# Altium schematic symbol library 13-Logic 数字 IC.SchLib: 324 symbols (part 6 of 30)
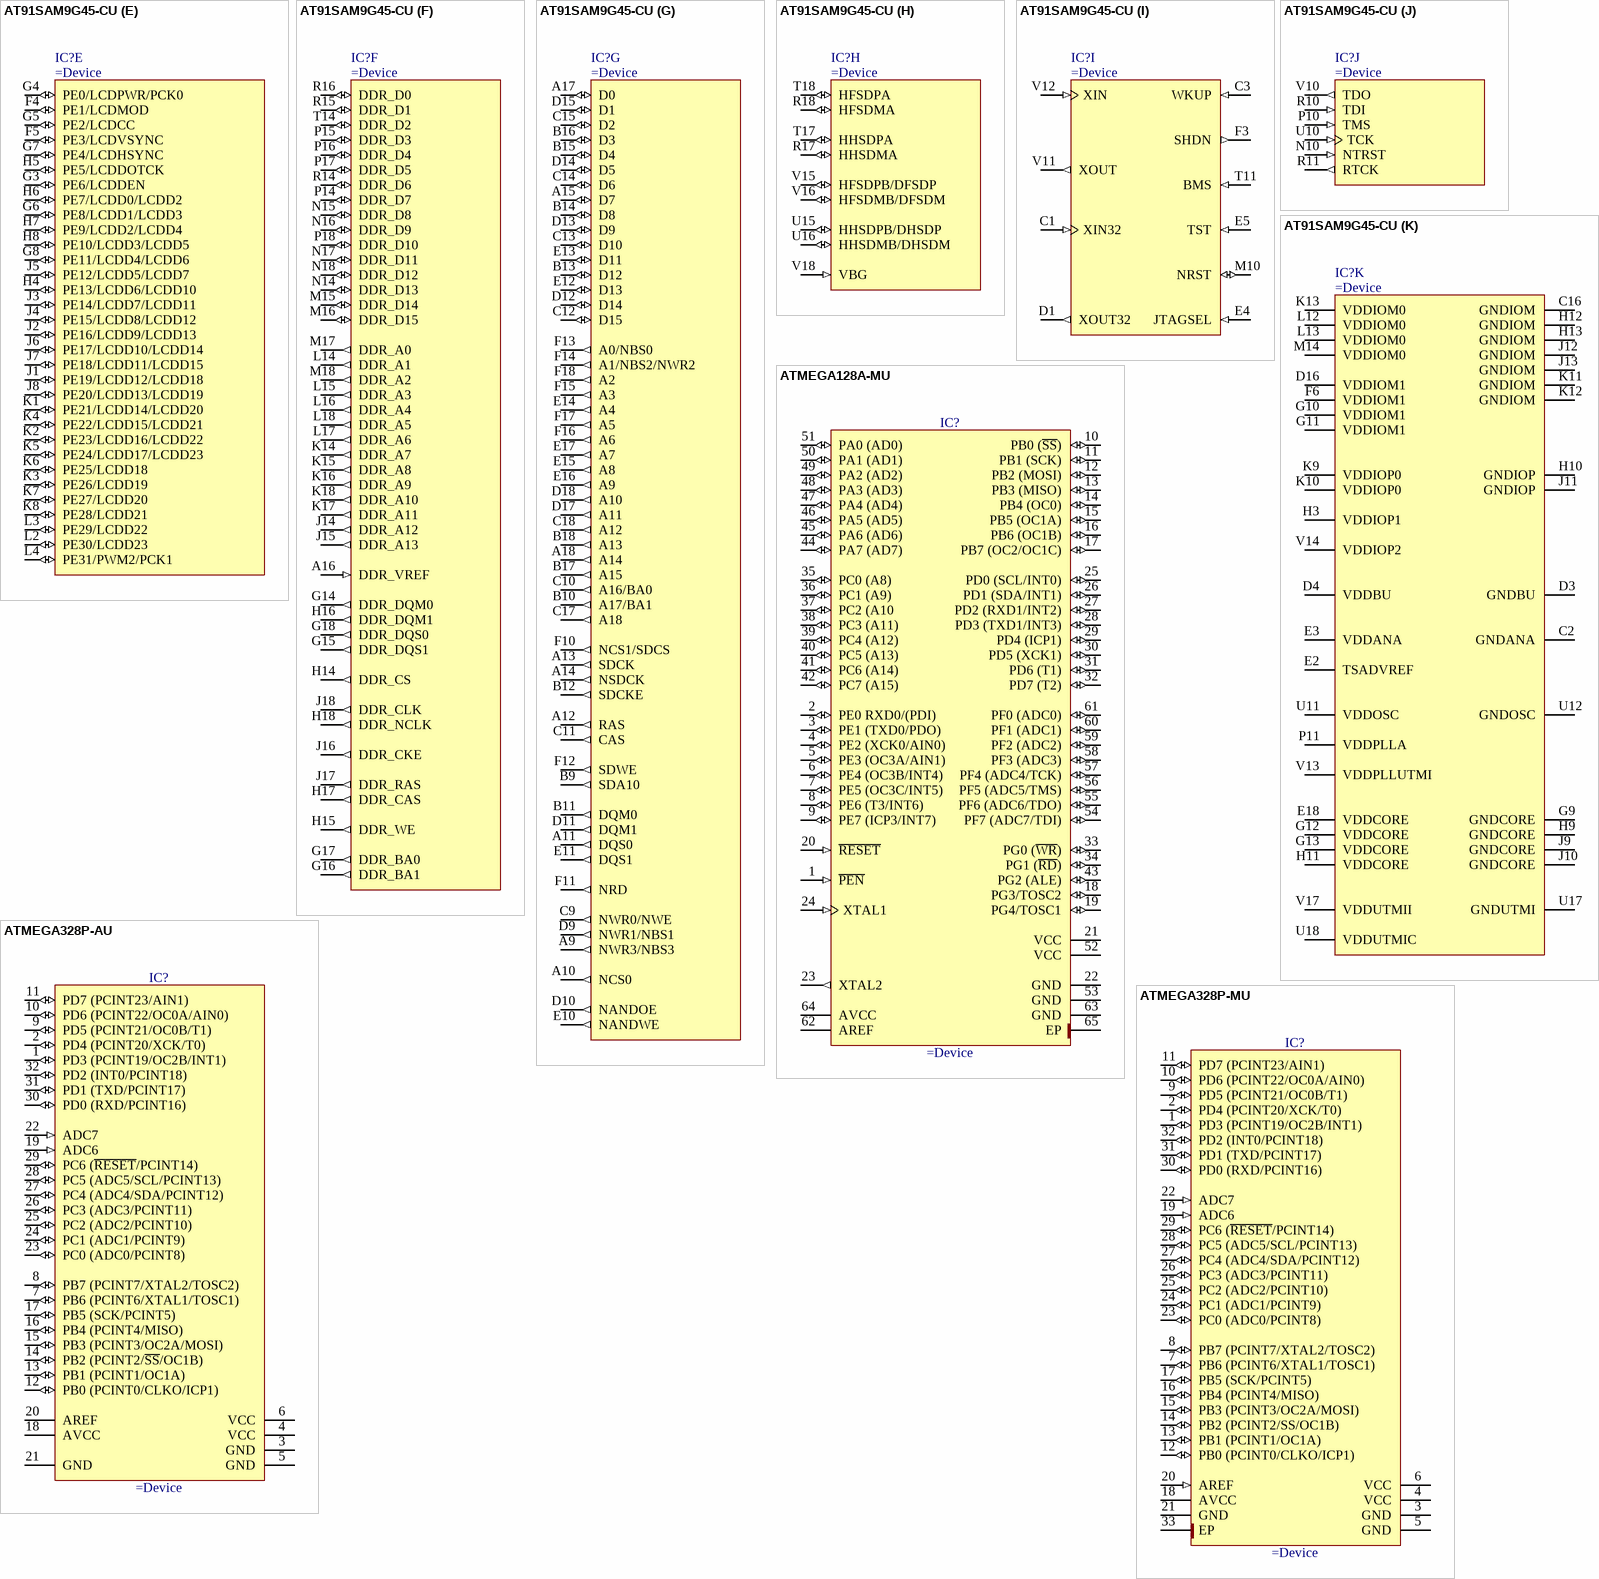
[diagram p169: symbols AT91SAM9G45-CU to ATMEGA328P-MU]

## AT91SAM9G45-CU
designator IC?
AT91 ARM Thumb 32-bit Embedded MPU, 400MHz, 64KB ROM, 64KB SRAM, EBI, E-MAC, HS USB, 24-ch. PDC, 324-Pin TFBGA, Industrial Grade (-40°C to 85°C), Pb-Free
part A pins: L1 PA0/MCI0_CK/TCLK3 (io), L5 PA2/MCI0_DA0/TIOB3 (io), L6 PA4/MCI0_DA2/TIOA4 (io), L7 PA8/MCI0_DA6/ERX2 (io), M1 PA1/MCI0_CDA/TIOA3 (io), M2 PA5/MCI0_DA3/TIOB4 (io), M3 PA6/MCI0_DA4/ETX2 (io), M4 PA7/MCI0_DA5/ETX3 (io), M5 PA10/ETX0 (io), M6 PA14/ETXEN (io), N1 PA3/MCI0_DA1/TCKL4 (io), N2 PA9/MCI0_DA7/ERX3 (io), N3 PA12/ERX0 (io), N4 PA15/ERXDV (io), N5 PA16/ERXER (io), N6 PA17/ETXCK (io), P1 PA11/ETX1 (io), P2 PA13/ERX1 (io), P3 PA19/EMDIO (io), P4 PA21/TWCK0 (io), P5 PA23/MCI1_DA0/RTS3 (io), R1 PA18/EMDC (io), R2 PA20/TWD0 (io), R3 PA24/MCI1_DA1/CTS3 (io), R4 PA30/MCI1_DA7/ECOL (io), T1 PA22/MCI1_CDA/SCK3 (io), T2 PA25/MCI1_DA2/PWM3 (io), T3 PA26/MCI1_DA3/TIOB2 (io), U1 PA27/MCI1_DA4/ETXER (io), U2 PA29/MCI1_DA6/ECRS (io), U3 PA28/MCI1_DA5/ERXCK (io), V1 PA31/MCI1_CK/PCK0 (io)
part B pins: M7 PB14/SPI1_MISO (io), M11 PB11/TWCK1/ISI_D11 (io), M12 PB25/ISI_D5 (io), M13 PB27/ISI_D7 (io), N7 PB18/RXD0/SPI0_NPCS1 (io), N11 PB9/RXD3/ISI_D9 (io), N12 PB24/ISI_D4 (io), N13 PB28/ISI_PCK (io), P6 PB12/DRXD (io), P7 PB19/TXD0/SPI0_NPCS2 (io), P12 PB20/ISI_D0 (io), P13 PB31/ISI_MCK/PCK1 (io), R5 PB4/TXD1 (io), R6 PB13/DTXD (io), R12 PB22/ISI_D2 (io), R13 PB29/ISI_VSYNC (io), T4 PB0/SPI0_MISO (io), T5 PB6/TXD2 (io), T6 PB16/SPI1_SPCK/SCK0 (io), T12 PB8/TXD3/ISI_D8 (io), T13 PB30/ISI_HSYNC (io), T15 PB21/ISI_D1 (io), T16 PB23/ISI_D3 (io), U4 PB3/SPI0_NPCS0 (io), U5 PB7/RXD2 (io), U6 PB17/SPI1_NPCS0/RTS0 (io), U13 PB10/TWD1/ISI_D10 (io), U14 PB26/ISI_D6 (io), V2 PB1/SPI0_MOSI (io), V3 PB2/SPI0_SPCK (io), V4 PB5/RXD1 (io), V5 PB15/SPI1_MOSI/CTS0 (io)
part C pins: A1 PC27/D27 (io), A2 PC28/D28 (io), A3 PC25/D25 (io), A4 PC20/D20 (io), A5 PC12/A25/CFRNW (io), A6 PC7/A24 (io), A7 PC5/A22/NANDCLE (io), A8 PC0/DQM2 (io), B1 PC31/D31 (io), B2 PC29/D29 (io), B3 PC30/D30 (io), B4 PC22/D22 (io), B5 PC17/D17 (io), B6 PC10/NCS4/CFCS0/TCLK2 (io), B7 PC11/NCS5/CFCS1/CTS2 (io), B8 PC2/A19 (io), C4 PC26/D26 (io), C5 PC21/D21 (io), C6 PC15/NWAIT (io), C7 PC9/CFCE2/RTS2 (io), C8 PC3/A20 (io), D5 PC24/D24 (io), D6 PC18/D18 (io), D7 PC13/NCS2 (io), D8 PC6/A23 (io), E6 PC23/D23 (io), E7 PC16/D16 (io), E8 PC8/CFCE1 (io), E9 PC1/DQM3 (io), F7 PC19/D19 (io), F8 PC14/NCS3/NANDCS (io), F9 PC4/A21/NANDALE (io)
part D pins: D2 PD20/TIOA0 (io), E1 PD21/TIOA1 (io), F1 PD22/TIOA2 (io), F2 PD24/SPI0_NPCS1/PWM0 (io), G1 PD25/SPI0_NPCS2/PWM1 (io), G2 PD23/TCLK0 (io), H1 PD26/PCK0/PWM2 (io), H2 PD27/PCK1/SPI0_NPCS3 (io), L8 PD2/TD0 (io), L9 PD13/RK1 (io), L10 PD29/TCLK1/SCK1 (io), L11 PD31/TIOB1/PWM1 (io), M8 PD4/RK0 (io), M9 PD15/RF1 (io), N8 PD6/AC97RX (io), N9 PD16/RTS1 (io), P8 PD8/AC97FS/TIOB5 (io), P9 PD28/TSADTRG/SPI1_NPCS1 (io), R7 PD0/TK0/PWM3 (io), R8 PD9/AC97CK/TCLK5 (io), R9 PD18/SPI1_NPCS2/IRQ (io), T7 PD1/TF0 (io), T8 PD11/RD1 (io), T9 PD19/SPI1_NPCS3/FIQ (io), T10 PD30/TIOB0/SCK2 (io), U7 PD7/AC97TX/TIOA5 (io), U8 PD10/TD1 (io), U9 PD14/TF1 (io), V6 PD3/RD0 (io), V7 PD5/RF0 (io), V8 PD12/TK1/PCK0 (io), V9 PD17/CTS1 (io)
part E pins: F4 PE1/LCDMOD (io), F5 PE3/LCDVSYNC (io), G3 PE6/LCDDEN (io), G4 PE0/LCDPWR/PCK0 (io), G5 PE2/LCDCC (io), G6 PE8/LCDD1/LCDD3 (io), G7 PE4/LCDHSYNC (io), G8 PE11/LCDD4/LCDD6 (io), H4 PE13/LCDD6/LCDD10 (io), H5 PE5/LCDDOTCK (io), H6 PE7/LCDD0/LCDD2 (io), H7 PE9/LCDD2/LCDD4 (io), H8 PE10/LCDD3/LCDD5 (io), J1 PE19/LCDD12/LCDD18 (io), J2 PE16/LCDD9/LCDD13 (io), J3 PE14/LCDD7/LCDD11 (io), J4 PE15/LCDD8/LCDD12 (io), J5 PE12/LCDD5/LCDD7 (io), J6 PE17/LCDD10/LCDD14 (io), J7 PE18/LCDD11/LCDD15 (io), J8 PE20/LCDD13/LCDD19 (io), K1 PE21/LCDD14/LCDD20 (io), K2 PE23/LCDD16/LCDD22 (io), K3 PE26/LCDD19 (io), K4 PE22/LCDD15/LCDD21 (io), K5 PE24/LCDD17/LCDD23 (io), K6 PE25/LCDD18 (io), K7 PE27/LCDD20 (io), K8 PE28/LCDD21 (io), L2 PE30/LCDD23 (io), L3 PE29/LCDD22 (io), L4 PE31/PWM2/PCK1 (io)
part F pins: A16 DDR_VREF (in), G14 DDR_DQM0 (out), G15 DDR_DQS1 (out), G16 DDR_BA1 (out), G17 DDR_BA0 (out), G18 DDR_DQS0 (out), H14 DDR_CS (out), H15 DDR_WE (out), H16 DDR_DQM1 (out), H17 DDR_CAS (out), H18 DDR_NCLK (out), J14 DDR_A12 (out), J15 DDR_A13 (out), J16 DDR_CKE (out), J17 DDR_RAS (out), J18 DDR_CLK (out), K14 DDR_A7 (out), K15 DDR_A8 (out), K16 DDR_A9 (out), K17 DDR_A11 (out), K18 DDR_A10 (out), L14 DDR_A1 (out), L15 DDR_A3 (out), L16 DDR_A4 (out), L17 DDR_A6 (out), L18 DDR_A5 (out), M15 DDR_D14 (io), M16 DDR_D15 (io), M17 DDR_A0 (out), M18 DDR_A2 (out), N14 DDR_D13 (io), N15 DDR_D8 (io), N16 DDR_D9 (io), N17 DDR_D11 (io), N18 DDR_D12 (io), P14 DDR_D7 (io), P15 DDR_D3 (io), P16 DDR_D4 (io), P17 DDR_D5 (io), P18 DDR_D10 (io), R14 DDR_D6 (io), R15 DDR_D1 (io), R16 DDR_D0 (io), T14 DDR_D2 (io)
part G pins: A9 NWR3/NBS3 (out), A10 NCS0 (out), A11 DQS0 (out), A12 RAS (out), A13 SDCK (out), A14 NSDCK (out), A15 D7 (io), A17 D0 (io), A18 A14 (out), B9 SDA10 (out), B10 A17/BA1 (out), B11 DQM0 (out), B12 SDCKE (out), B13 D12 (io), B14 D8 (io), B15 D4 (io), B16 D3 (io), B17 A15 (out), B18 A13 (out), C9 NWR0/NWE (out), C10 A16/BA0 (out), C11 CAS (out), C12 D15 (io), C13 D10 (io), C14 D6 (io), C15 D2 (io), C17 A18 (out), C18 A12 (out), D9 NWR1/NBS1 (out), D10 NANDOE (out), D11 DQM1 (out), D12 D14 (io), D13 D9 (io), D14 D5 (io), D15 D1 (io), D17 A11 (out), D18 A10 (out), E10 NANDWE (out), E11 DQS1 (out), E12 D13 (io), E13 D11 (io), E14 A4 (out), E15 A8 (out), E16 A9 (out), E17 A7 (out), F10 NCS1/SDCS (out), F11 NRD (out), F12 SDWE (out), F13 A0/NBS0 (out), F14 A1/NBS2/NWR2 (out), F15 A3 (out), F16 A6 (out), F17 A5 (out), F18 A2 (out)
part H pins: R17 HHSDMA (io), R18 HFSDMA (io), T17 HHSDPA (io), T18 HFSDPA (io), U15 HHSDPB/DHSDP (io), U16 HHSDMB/DHSDM (io), V15 HFSDPB/DFSDP (io), V16 HFSDMB/DFSDM (io), V18 VBG (in)
part I pins: C1 XIN32 (in), C3 WKUP (in), D1 XOUT32 (out), E4 JTAGSEL (in), E5 TST (in), F3 SHDN (out), M10 NRST (io), T11 BMS (in), V11 XOUT (out), V12 XIN (in)
part J pins: N10 NTRST (in), P10 TMS (in), R10 TDI (in), R11 RTCK (out), U10 TCK (in), V10 TDO (out)
part K pins: C2 GNDANA (power), C16 GNDIOM (power), D3 GNDBU (power), D4 VDDBU (power), D16 VDDIOM1 (power), E2 TSADVREF (power), E3 VDDANA (power), E18 VDDCORE (power), F6 VDDIOM1 (power), G9 GNDCORE (power), G10 VDDIOM1 (power), G11 VDDIOM1 (power), G12 VDDCORE (power), G13 VDDCORE (power), H3 VDDIOP1 (power), H9 GNDCORE (power), H10 GNDIOP (power), H11 VDDCORE (power), H12 GNDIOM (power), H13 GNDIOM (power), J9 GNDCORE (power), J10 GNDCORE (power), J11 GNDIOP (power), J12 GNDIOM (power), J13 GNDIOM (power), K9 VDDIOP0 (power), K10 VDDIOP0 (power), K11 GNDIOM (power), K12 GNDIOM (power), K13 VDDIOM0 (power), L12 VDDIOM0 (power), L13 VDDIOM0 (power), M14 VDDIOM0 (power), P11 VDDPLLA (power), U11 VDDOSC (power), U12 GNDOSC (power), U17 GNDUTMI (power), U18 VDDUTMIC (power), V13 VDDPLLUTMI (power), V14 VDDIOP2 (power), V17 VDDUTMII (power)

## ATMEGA128A-MU
designator IC?
8-bit AVR Microcontroller, 2.7-5.5V, 16MHz, 128KB Flash, 4KB EEPROM, 4KB SRAM, 64-pin MLF, Industrial Grade (-40°C to 85°C)
pins: 1 ~{PEN} (in), 2 PE0 RXD0/(PDI) (io), 3 PE1 (TXD0/PDO) (io), 4 PE2 (XCK0/AIN0) (io), 5 PE3 (OC3A/AIN1) (io), 6 PE4 (OC3B/INT4) (io), 7 PE5 (OC3C/INT5) (io), 8 PE6 (T3/INT6) (io), 9 PE7 (ICP3/INT7) (io), 10 PB0 (~{SS}) (io), 11 PB1 (SCK) (io), 12 PB2 (MOSI) (io), 13 PB3 (MISO) (io), 14 PB4 (OC0) (io), 15 PB5 (OC1A) (io), 16 PB6 (OC1B) (io), 17 PB7 (OC2/OC1C) (io), 18 PG3/TOSC2 (io), 19 PG4/TOSC1 (io), 20 ~{RESET} (in), 21 VCC (power), 22 GND (power), 23 XTAL2 (out), 24 XTAL1 (in), 25 PD0 (SCL/INT0) (io), 26 PD1 (SDA/INT1) (io), 27 PD2 (RXD1/INT2) (io), 28 PD3 (TXD1/INT3) (io), 29 PD4 (ICP1) (io), 30 PD5 (XCK1) (io), 31 PD6 (T1) (io), 32 PD7 (T2) (io), 33 PG0 (~{WR}) (io), 34 PG1 (~{RD}) (io), 35 PC0 (A8) (io), 36 PC1 (A9) (io), 37 PC2 (A10 (io), 38 PC3 (A11) (io), 39 PC4 (A12) (io), 40 PC5 (A13) (io), 41 PC6 (A14) (io), 42 PC7 (A15) (io), 43 PG2 (ALE) (io), 44 PA7 (AD7) (io), 45 PA6 (AD6) (io), 46 PA5 (AD5) (io), 47 PA4 (AD4) (io), 48 PA3 (AD3) (io), 49 PA2 (AD2) (io), 50 PA1 (AD1) (io), 51 PA0 (AD0) (io), 52 VCC (power), 53 GND (power), 54 PF7 (ADC7/TDI) (io), 55 PF6 (ADC6/TDO) (io), 56 PF5 (ADC5/TMS) (io), 57 PF4 (ADC4/TCK) (io), 58 PF3 (ADC3) (io), 59 PF2 (ADC2) (io), 60 PF1 (ADC1) (io), 61 PF0 (ADC0) (io), 62 AREF (power), 63 GND (power), 64 AVCC (power), 65 EP

## ATMEGA328P-AU
designator IC?
8-bit AVR Microcontroller, 32KB Flash, 1KB EEPROM, 2KB SRAM, 32-pin TQFP, Industrial Grade (-40°C to 85°C)
pins: 1 PD3 (PCINT19/OC2B/INT1) (io), 2 PD4 (PCINT20/XCK/T0) (io), 3 GND (power), 4 VCC (power), 5 GND (power), 6 VCC (power), 7 PB6 (PCINT6/XTAL1/TOSC1) (io), 8 PB7 (PCINT7/XTAL2/TOSC2) (io), 9 PD5 (PCINT21/OC0B/T1) (io), 10 PD6 (PCINT22/OC0A/AIN0) (io), 11 PD7 (PCINT23/AIN1) (io), 12 PB0 (PCINT0/CLKO/ICP1) (io), 13 PB1 (PCINT1/OC1A) (io), 14 PB2 (PCINT2/~{SS}/OC1B) (io), 15 PB3 (PCINT3/OC2A/MOSI) (io), 16 PB4 (PCINT4/MISO) (io), 17 PB5 (SCK/PCINT5) (io), 18 AVCC (power), 19 ADC6 (in), 20 AREF, 21 GND (power), 22 ADC7 (in), 23 PC0 (ADC0/PCINT8) (io), 24 PC1 (ADC1/PCINT9) (io), 25 PC2 (ADC2/PCINT10) (io), 26 PC3 (ADC3/PCINT11) (io), 27 PC4 (ADC4/SDA/PCINT12) (io), 28 PC5 (ADC5/SCL/PCINT13) (io), 29 PC6 (~{RESET}/PCINT14) (io), 30 PD0 (RXD/PCINT16) (io), 31 PD1 (TXD/PCINT17) (io), 32 PD2 (INT0/PCINT18) (io)

## ATMEGA328P-MU
designator IC?
8-bit AVR 20MHz Microcontroller With 32K Bytes In-System  Programmable  Flash
pins: 1 PD3 (PCINT19/OC2B/INT1) (io), 2 PD4 (PCINT20/XCK/T0) (io), 3 GND (power), 4 VCC (power), 5 GND (power), 6 VCC (power), 7 PB6 (PCINT6/XTAL1/TOSC1) (io), 8 PB7 (PCINT7/XTAL2/TOSC2) (io), 9 PD5 (PCINT21/OC0B/T1) (io), 10 PD6 (PCINT22/OC0A/AIN0) (io), 11 PD7 (PCINT23/AIN1) (io), 12 PB0 (PCINT0/CLKO/ICP1) (io), 13 PB1 (PCINT1/OC1A) (io), 14 PB2 (PCINT2/SS/OC1B) (io), 15 PB3 (PCINT3/OC2A/MOSI) (io), 16 PB4 (PCINT4/MISO) (io), 17 PB5 (SCK/PCINT5) (io), 18 AVCC (power), 19 ADC6 (in), 20 AREF (in), 21 GND (power), 22 ADC7 (in), 23 PC0 (ADC0/PCINT8) (io), 24 PC1 (ADC1/PCINT9) (io), 25 PC2 (ADC2/PCINT10) (io), 26 PC3 (ADC3/PCINT11) (io), 27 PC4 (ADC4/SDA/PCINT12) (io), 28 PC5 (ADC5/SCL/PCINT13) (io), 29 PC6 (~{RESET}/PCINT14) (io), 30 PD0 (RXD/PCINT16) (io), 31 PD1 (TXD/PCINT17) (io), 32 PD2 (INT0/PCINT18) (io), 33 EP (power)

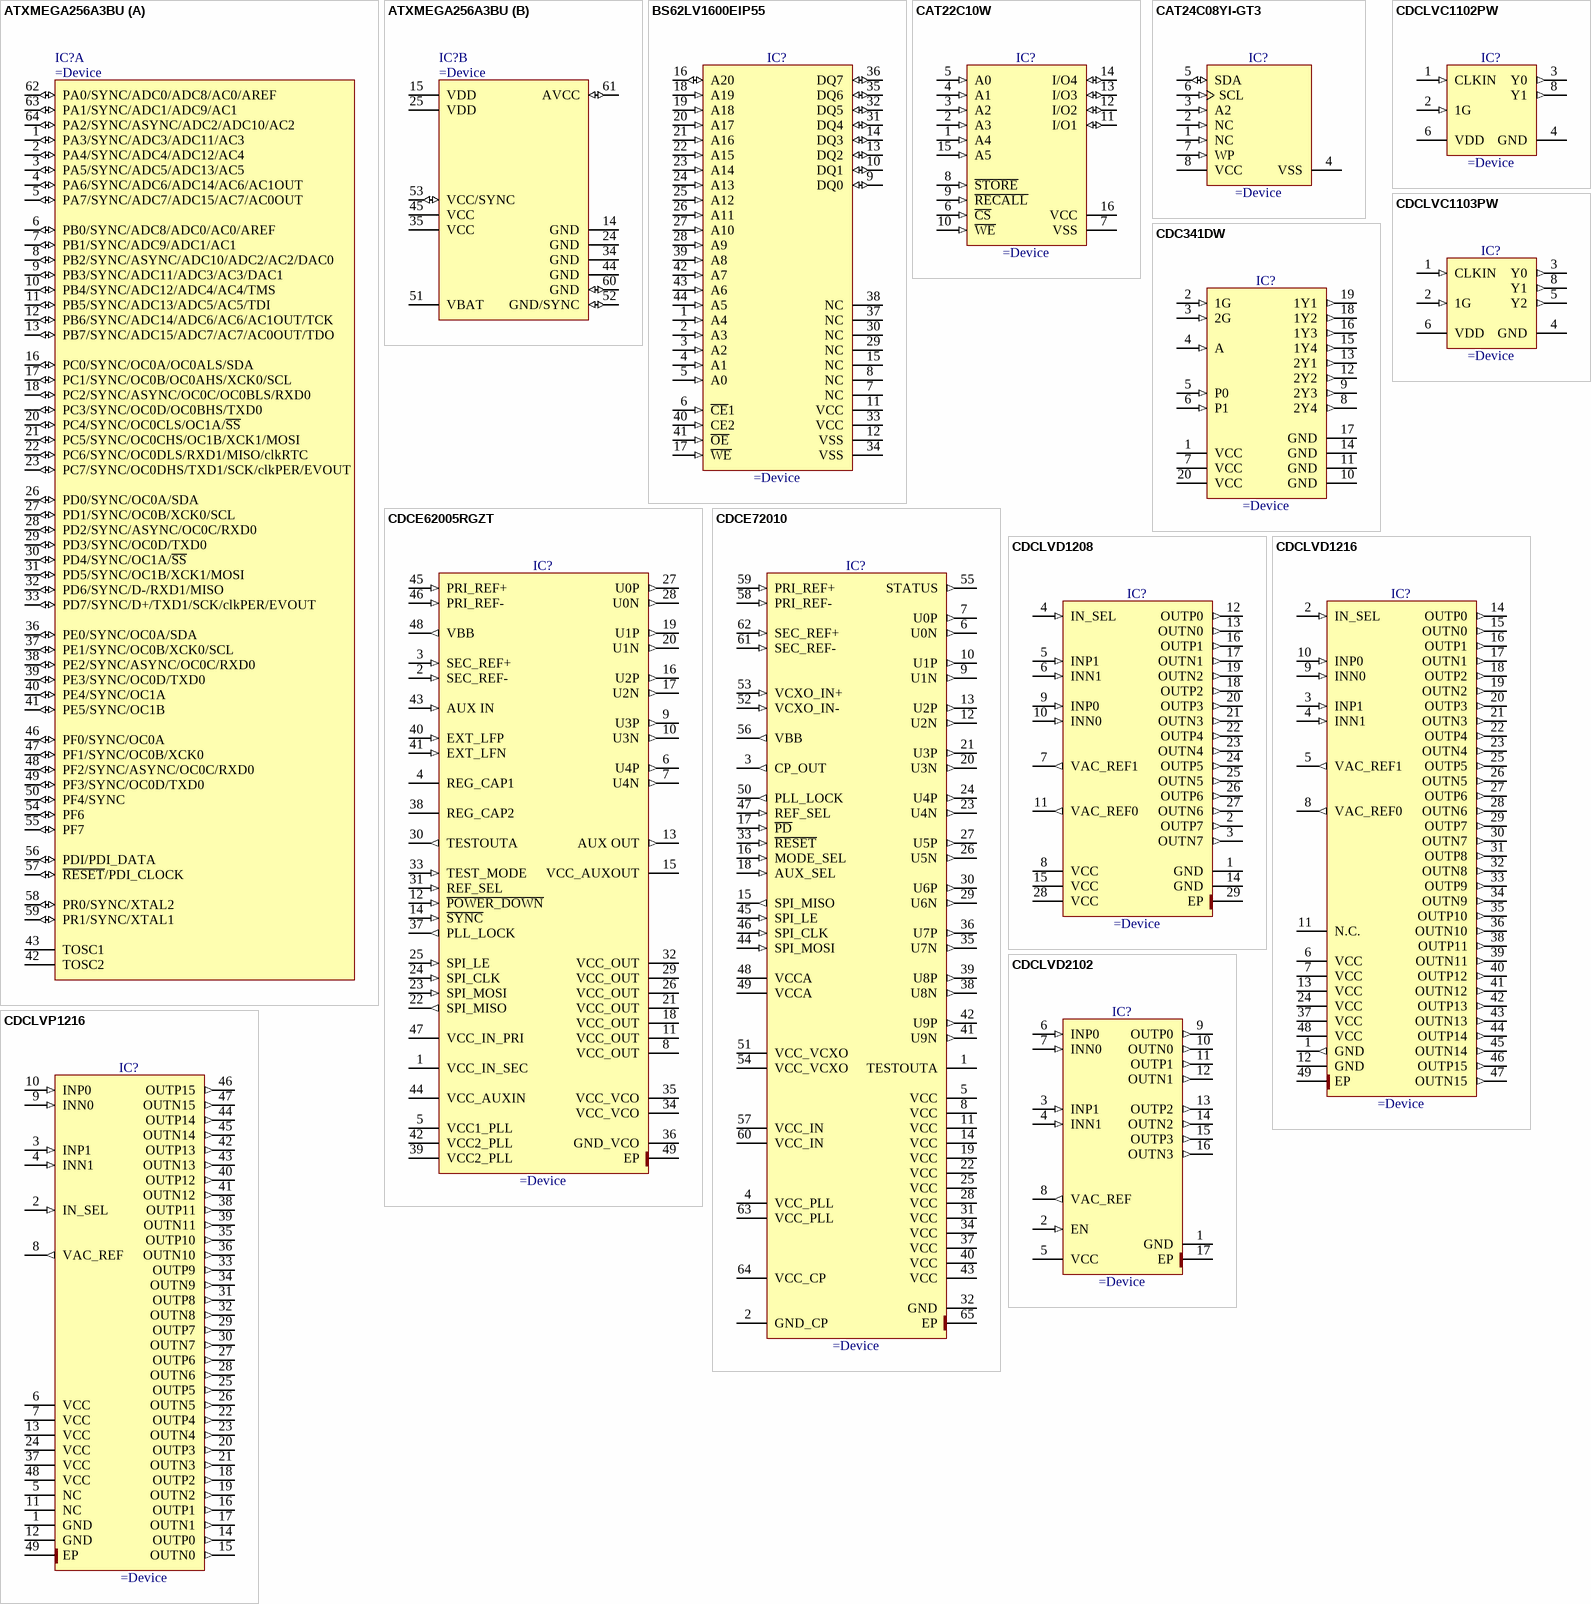
[diagram p32: symbols ATXMEGA256A3BU to CDCLVP1216]

## ATXMEGA256A3BU
designator IC?
8/16-bit XMEGA A3BU 32MHz Microcontroller With 256KBytes of in-System Self-Programmable Flash
part A pins: 1 PA3/SYNC/ADC3/ADC11/AC3 (io), 2 PA4/SYNC/ADC4/ADC12/AC4 (io), 3 PA5/SYNC/ADC5/ADC13/AC5 (io), 4 PA6/SYNC/ADC6/ADC14/AC6/AC1OUT (io), 5 PA7/SYNC/ADC7/ADC15/AC7/AC0OUT (io), 6 PB0/SYNC/ADC8/ADC0/AC0/AREF (io), 7 PB1/SYNC/ADC9/ADC1/AC1 (io), 8 PB2/SYNC/ASYNC/ADC10/ADC2/AC2/DAC0 (io), 9 PB3/SYNC/ADC11/ADC3/AC3/DAC1 (io), 10 PB4/SYNC/ADC12/ADC4/AC4/TMS (io), 11 PB5/SYNC/ADC13/ADC5/AC5/TDI (io), 12 PB6/SYNC/ADC14/ADC6/AC6/AC1OUT/TCK (io), 13 PB7/SYNC/ADC15/ADC7/AC7/AC0OUT/TDO (io), 16 PC0/SYNC/OC0A/OC0ALS/SDA (io), 17 PC1/SYNC/OC0B/OC0AHS/XCK0/SCL (io), 18 PC2/SYNC/ASYNC/OC0C/OC0BLS/RXD0 (io), 19 PC3/SYNC/OC0D/OC0BHS/TXD0 (io), 20 PC4/SYNC/OC0CLS/OC1A/~{SS} (io), 21 PC5/SYNC/OC0CHS/OC1B/XCK1/MOSI (io), 22 PC6/SYNC/OC0DLS/RXD1/MISO/clkRTC (io), 23 PC7/SYNC/OC0DHS/TXD1/SCK/clkPER/EVOUT (io), 26 PD0/SYNC/OC0A/SDA (io), 27 PD1/SYNC/OC0B/XCK0/SCL (io), 28 PD2/SYNC/ASYNC/OC0C/RXD0 (io), 29 PD3/SYNC/OC0D/TXD0 (io), 30 PD4/SYNC/OC1A/~{SS} (io), 31 PD5/SYNC/OC1B/XCK1/MOSI (io), 32 PD6/SYNC/D-/RXD1/MISO (io), 33 PD7/SYNC/D+/TXD1/SCK/clkPER/EVOUT (io), 36 PE0/SYNC/OC0A/SDA (io), 37 PE1/SYNC/OC0B/XCK0/SCL (io), 38 PE2/SYNC/ASYNC/OC0C/RXD0 (io), 39 PE3/SYNC/OC0D/TXD0 (io), 40 PE4/SYNC/OC1A (io), 41 PE5/SYNC/OC1B (io), 42 TOSC2, 43 TOSC1, 46 PF0/SYNC/OC0A (io), 47 PF1/SYNC/OC0B/XCK0 (io), 48 PF2/SYNC/ASYNC/OC0C/RXD0 (io), 49 PF3/SYNC/OC0D/TXD0 (io), 50 PF4/SYNC (io), 54 PF6 (io), 55 PF7 (io), 56 PDI/PDI_DATA (io), 57 ~{RESET}/PDI_CLOCK (io), 58 PR0/SYNC/XTAL2 (io), 59 PR1/SYNC/XTAL1 (io), 62 PA0/SYNC/ADC0/ADC8/AC0/AREF (io), 63 PA1/SYNC/ADC1/ADC9/AC1 (io), 64 PA2/SYNC/ASYNC/ADC2/ADC10/AC2 (io)
part B pins: 14 GND (power), 15 VDD (power), 24 GND (power), 25 VDD (power), 34 GND (power), 35 VCC (power), 44 GND (power), 45 VCC (power), 51 VBAT (power), 52 GND/SYNC (io), 53 VCC/SYNC (io), 60 GND (io), 61 AVCC (io)

## BS62LV1600EIP55
designator IC?
2.4V-5.5V Low Power 2M x 8Bit CMOS SRAM
pins: 1 A4 (in), 2 A3 (in), 3 A2 (in), 4 A1 (in), 5 A0 (in), 6 ~{CE}1 (in), 7 NC, 8 NC, 9 DQ0 (io), 10 DQ1 (io), 11 VCC (power), 12 VSS (power), 13 DQ2 (io), 14 DQ3 (io), 15 NC, 16 A20 (io), 17 ~{WE} (in), 18 A19 (in), 19 A18 (in), 20 A17 (in), 21 A16 (in), 22 A15 (in), 23 A14 (in), 24 A13 (in), 25 A12 (in), 26 A11 (in), 27 A10 (in), 28 A9 (in), 29 NC, 30 NC, 31 DQ4 (io), 32 DQ5 (io), 33 VCC (power), 34 VSS (power), 35 DQ6 (io), 36 DQ7 (io), 37 NC, 38 NC, 39 A8 (in), 40 CE2 (in), 41 ~{OE} (in), 42 A7 (in), 43 A6 (in), 44 A5 (in)

## CAT22C10W
designator IC?
256 bit NV CMOS Static RAM
pins: 1 A4 (in), 2 A3 (in), 3 A2 (in), 4 A1 (in), 5 A0 (in), 6 ~{CS} (in), 7 VSS (power), 8 ~{STORE} (in), 9 ~{RECALL} (in), 10 ~{WE} (in), 11 I/O1 (io), 12 I/O2 (io), 13 I/O3 (io), 14 I/O4 (io), 15 A5 (in), 16 VCC (power)

## CAT24C08YI-GT3
designator IC?
1.7V-5.5V, 8K I2C Serial EEPROM Memory
pins: 1 NC (in), 2 NC (in), 3 A2 (in), 4 VSS (power), 5 SDA (io), 6 SCL (in), 7 WP (in), 8 VCC (power)

## CDC341DW
designator IC?
1-Line to 8-Line Clock Buffer
pins: 1 VCC (power), 2 1G (in), 3 2G (in), 4 A (in), 5 P0 (in), 6 P1 (in), 7 VCC (power), 8 2Y4 (out), 9 2Y3 (out), 10 GND (power), 11 GND (power), 12 2Y2 (out), 13 2Y1 (out), 14 GND (power), 15 1Y4 (out), 16 1Y3 (out), 17 GND (power), 18 1Y2 (out), 19 1Y1 (out), 20 VCC (power)

## CDCE62005RGZT
designator IC?
5/10 Outputs Clock Generator/Jitter Cleaner with Integrated Dual VCO
pins: 1 VCC_IN_SEC (power), 2 SEC_REF- (in), 3 SEC_REF+ (in), 4 REG_CAP1, 5 VCC1_PLL (power), 6 U4P (out), 7 U4N (out), 8 VCC_OUT (power), 9 U3P (out), 10 U3N (out), 11 VCC_OUT (power), 12 ~{POWER_DOWN} (in), 13 AUX OUT (out), 14 ~{SYNC} (in), 15 VCC_AUXOUT (power), 16 U2P (out), 17 U2N (out), 18 VCC_OUT (power), 19 U1P (out), 20 U1N (out), 21 VCC_OUT (power), 22 SPI_MISO (out), 23 SPI_MOSI (in), 24 SPI_CLK (in), 25 SPI_LE (in), 26 VCC_OUT (power), 27 U0P (out), 28 U0N (out), 29 VCC_OUT (power), 30 TESTOUTA (out), 31 REF_SEL (in), 32 VCC_OUT (power), 33 TEST_MODE (in), 34 VCC_VCO (power), 35 VCC_VCO (power), 36 GND_VCO (power), 37 PLL_LOCK (out), 38 REG_CAP2, 39 VCC2_PLL (power), 40 EXT_LFP (in), 41 EXT_LFN (in), 42 VCC2_PLL (power), 43 AUX IN (in), 44 VCC_AUXIN (power), 45 PRI_REF+ (in), 46 PRI_REF- (in), 47 VCC_IN_PRI (power), 48 VBB (out), 49 EP (power)

## CDCE72010
designator IC?
Ten Output High Performance Clock Synchronizer, Jitter Cleaner, and Clock Distributor
pins: 1 TESTOUTA, 2 GND_CP (power), 3 CP_OUT (out), 4 VCC_PLL (power), 5 VCC (power), 6 U0N (out), 7 U0P (out), 8 VCC (power), 9 U1N (out), 10 U1P (out), 11 VCC (power), 12 U2N (out), 13 U2P (out), 14 VCC (power), 15 SPI_MISO (out), 16 MODE_SEL (in), 17 ~{PD} (in), 18 AUX_SEL (in), 19 VCC (power), 20 U3N (out), 21 U3P (out), 22 VCC (power), 23 U4N (out), 24 U4P (out), 25 VCC (power), 26 U5N (out), 27 U5P (out), 28 VCC (power), 29 U6N (out), 30 U6P (out), 31 VCC (power), 32 GND (power), 33 ~{RESET} (in), 34 VCC (power), 35 U7N (out), 36 U7P (out), 37 VCC (power), 38 U8N (out), 39 U8P (out), 40 VCC (power), 41 U9N (out), 42 U9P (out), 43 VCC (power), 44 SPI_MOSI (in), 45 SPI_LE (in), 46 SPI_CLK (in), 47 REF_SEL (in), 48 VCCA (power), 49 VCCA (power), 50 PLL_LOCK (out), 51 VCC_VCXO (power), 52 VCXO_IN- (in), 53 VCXO_IN+ (in), 54 VCC_VCXO (power), 55 STATUS (out), 56 VBB (out), 57 VCC_IN (power), 58 PRI_REF- (in), 59 PRI_REF+ (in), 60 VCC_IN (power), 61 SEC_REF- (in), 62 SEC_REF+ (in), 63 VCC_PLL (power), 64 VCC_CP (power), 65 EP (power)

## CDCLVC1102PW
designator IC?
3.3 V and 2.5 V LVCMOS 1:2  High-Performance Clock Buffer
pins: 1 CLKIN (in), 2 1G (in), 3 Y0 (out), 4 GND (power), 6 VDD (power), 8 Y1 (out)

## CDCLVC1103PW
designator IC?
3.3 V and 2.5 V LVCMOS 1:2 High-Performance Clock Buffer
pins: 1 CLKIN (in), 2 1G (in), 3 Y0 (out), 4 GND (power), 5 Y2 (out), 6 VDD (power), 8 Y1 (out)

## CDCLVD1208
designator IC?
2:8 Low Additive Jitter LVDS Buffer
pins: 1 GND (power), 2 OUTP7 (out), 3 OUTN7 (out), 4 IN_SEL (in), 5 INP1 (in), 6 INN1 (in), 7 VAC_REF1 (out), 8 VCC (power), 9 INP0 (in), 10 INN0 (in), 11 VAC_REF0 (out), 12 OUTP0 (out), 13 OUTN0 (out), 14 GND (power), 15 VCC (power), 16 OUTP1 (out), 17 OUTN1 (out), 18 OUTP2 (out), 19 OUTN2 (out), 20 OUTP3 (out), 21 OUTN3 (out), 22 OUTP4 (out), 23 OUTN4 (out), 24 OUTP5 (out), 25 OUTN5 (out), 26 OUTP6 (out), 27 OUTN6 (out), 28 VCC (power), 29 EP (power)

## CDCLVD1216
designator IC?
2:16 Low Additive Jitter LVDS Buffer
pins: 1 GND (out), 2 IN_SEL (in), 3 INP1 (in), 4 INN1 (in), 5 VAC_REF1 (out), 6 VCC (power), 7 VCC (power), 8 VAC_REF0 (out), 9 INN0 (in), 10 INP0 (in), 11 N.C., 12 GND (power), 13 VCC (power), 14 OUTP0 (out), 15 OUTN0 (out), 16 OUTP1 (out), 17 OUTN1 (out), 18 OUTP2 (out), 19 OUTN2 (out), 20 OUTP3 (out), 21 OUTN3 (out), 22 OUTP4 (out), 23 OUTN4 (out), 24 VCC (power), 25 OUTP5 (out), 26 OUTN5 (out), 27 OUTP6 (out), 28 OUTN6 (out), 29 OUTP7 (out), 30 OUTN7 (out), 31 OUTP8 (out), 32 OUTN8 (out), 33 OUTP9 (out), 34 OUTN9 (out), 35 OUTP10 (out), 36 OUTN10 (out), 37 VCC (power), 38 OUTP11 (out), 39 OUTN11 (out), 40 OUTP12 (out), 41 OUTN12 (out), 42 OUTP13 (out), 43 OUTN13 (out), 44 OUTP14 (out), 45 OUTN14 (out), 46 OUTP15 (out), 47 OUTN15 (out), 48 VCC (power), 49 EP (power)

## CDCLVD2102
designator IC?
Dual 1:2 Low Additive Jitter LVDS Buffer
pins: 1 GND (power), 2 EN (in), 3 INP1 (in), 4 INN1 (in), 5 VCC (power), 6 INP0 (in), 7 INN0 (in), 8 VAC_REF (out), 9 OUTP0 (out), 10 OUTN0 (out), 11 OUTP1 (out), 12 OUTN1 (out), 13 OUTP2 (out), 14 OUTN2 (out), 15 OUTP3 (out), 16 OUTN3 (out), 17 EP (power)

## CDCLVP1216
designator IC?
Low Jitter, 2-Input Selectable 1:16 Universal-to-LVPECL Buffer
pins: 1 GND (power), 2 IN_SEL (in), 3 INP1 (in), 4 INN1 (in), 5 NC, 6 VCC (power), 7 VCC (power), 8 VAC_REF (out), 9 INN0 (in), 10 INP0 (in), 11 NC, 12 GND (power), 13 VCC (power), 14 OUTP0 (out), 15 OUTN0 (out), 16 OUTP1 (out), 17 OUTN1 (out), 18 OUTP2 (out), 19 OUTN2 (out), 20 OUTP3 (out), 21 OUTN3 (out), 22 OUTP4 (out), 23 OUTN4 (out), 24 VCC (power), 25 OUTP5 (out), 26 OUTN5 (out), 27 OUTP6 (out), 28 OUTN6 (out), 29 OUTP7 (out), 30 OUTN7 (out), 31 OUTP8 (out), 32 OUTN8 (out), 33 OUTP9 (out), 34 OUTN9 (out), 35 OUTP10 (out), 36 OUTN10 (out), 37 VCC (power), 38 OUTP11 (out), 39 OUTN11 (out), 40 OUTP12 (out), 41 OUTN12 (out), 42 OUTP13 (out), 43 OUTN13 (out), 44 OUTP14 (out), 45 OUTN14 (out), 46 OUTP15 (out), 47 OUTN15 (out), 48 VCC (power), 49 EP (power)

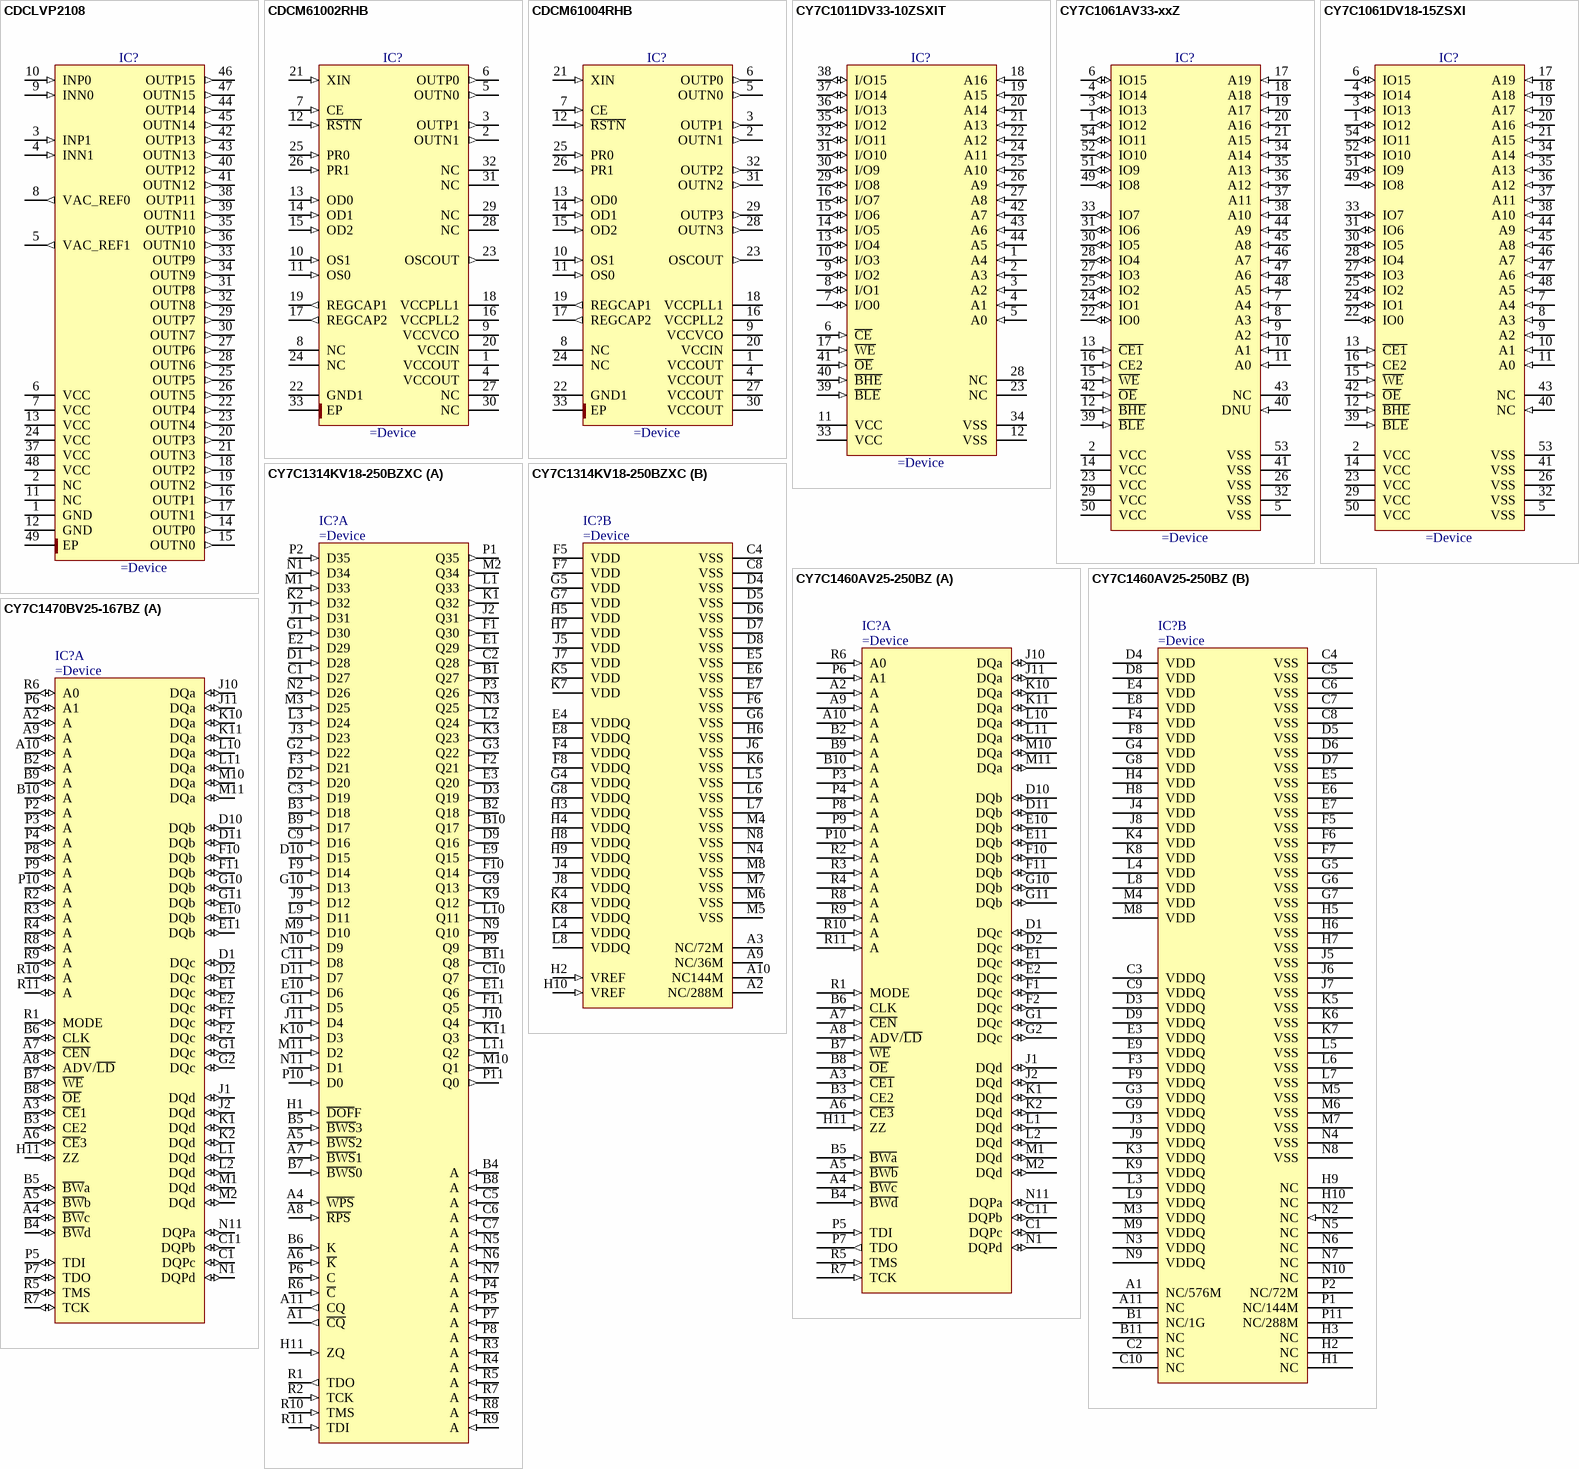
[diagram p33: symbols CDCLVP2108 to CY7C1470BV25-167BZ]

## CDCLVP2108
designator IC?
16 LVPECL Output, High-Performance Clock Buffer
pins: 1 GND (power), 2 NC, 3 INP1 (in), 4 INN1 (in), 5 VAC_REF1 (out), 6 VCC (power), 7 VCC (power), 8 VAC_REF0 (out), 9 INN0 (in), 10 INP0 (in), 11 NC, 12 GND (power), 13 VCC (power), 14 OUTP0 (out), 15 OUTN0 (out), 16 OUTP1 (out), 17 OUTN1 (out), 18 OUTP2 (out), 19 OUTN2 (out), 20 OUTP3 (out), 21 OUTN3 (out), 22 OUTP4 (out), 23 OUTN4 (out), 24 VCC (power), 25 OUTP5 (out), 26 OUTN5 (out), 27 OUTP6 (out), 28 OUTN6 (out), 29 OUTP7 (out), 30 OUTN7 (out), 31 OUTP8 (out), 32 OUTN8 (out), 33 OUTP9 (out), 34 OUTN9 (out), 35 OUTP10 (out), 36 OUTN10 (out), 37 VCC (power), 38 OUTP11 (out), 39 OUTN11 (out), 40 OUTP12 (out), 41 OUTN12 (out), 42 OUTP13 (out), 43 OUTN13 (out), 44 OUTP14 (out), 45 OUTN14 (out), 46 OUTP15 (out), 47 OUTN15 (out), 48 VCC (power), 49 EP (power)

## CDCM61002RHB
designator IC?
Two Output, Integrated VCO, Low-Jitter Clock Generator
pins: 1 VCCOUT (power), 2 OUTN1 (out), 3 OUTP1 (out), 4 VCCOUT (power), 5 OUTN0 (out), 6 OUTP0 (out), 7 CE (in), 8 NC, 9 VCCVCO (power), 10 OS1 (in), 11 OS0 (in), 12 ~{RSTN} (in), 13 OD0 (in), 14 OD1 (in), 15 OD2 (in), 16 VCCPLL2 (power), 17 REGCAP2 (out), 18 VCCPLL1 (power), 19 REGCAP1 (out), 20 VCCIN (power), 21 XIN (in), 22 GND1 (power), 23 OSCOUT (out), 24 NC, 25 PR0 (in), 26 PR1 (in), 27 NC, 28 NC, 29 NC, 30 NC, 31 NC, 32 NC, 33 EP (power)

## CDCM61004RHB
designator IC?
Four Output, Integrated VCO, Low-Jitter Clock Generator
pins: 1 VCCOUT (power), 2 OUTN1 (out), 3 OUTP1 (out), 4 VCCOUT (power), 5 OUTN0 (out), 6 OUTP0 (out), 7 CE (in), 8 NC, 9 VCCVCO (power), 10 OS1 (in), 11 OS0 (in), 12 ~{RSTN} (in), 13 OD0 (in), 14 OD1 (in), 15 OD2 (in), 16 VCCPLL2 (power), 17 REGCAP2 (out), 18 VCCPLL1 (power), 19 REGCAP1 (out), 20 VCCIN (power), 21 XIN (in), 22 GND1 (power), 23 OSCOUT (out), 24 NC, 25 PR0 (in), 26 PR1 (in), 27 VCCOUT (power), 28 OUTN3 (out), 29 OUTP3 (out), 30 VCCOUT (power), 31 OUTN2 (out), 32 OUTP2 (out), 33 EP (power)

## CY7C1011DV33-10ZSXIT
designator IC?
2Mbit (128K x 16), 10ns 3.3V Static RAM
pins: 1 A4 (in), 2 A3 (in), 3 A2 (in), 4 A1 (in), 5 A0 (in), 6 ~{CE} (in), 7 I/O0 (io), 8 I/O1 (io), 9 I/O2 (io), 10 I/O3 (io), 11 VCC (power), 12 VSS (power), 13 I/O4 (io), 14 I/O5 (io), 15 I/O6 (io), 16 I/O7 (io), 17 ~{WE} (in), 18 A16 (in), 19 A15 (in), 20 A14 (in), 21 A13 (in), 22 A12 (in), 23 NC, 24 A11 (in), 25 A10 (in), 26 A9 (in), 27 A8 (in), 28 NC, 29 I/O8 (io), 30 I/O9 (io), 31 I/O10 (io), 32 I/O11 (io), 33 VCC (power), 34 VSS (power), 35 I/O12 (io), 36 I/O13 (io), 37 I/O14 (io), 38 I/O15 (io), 39 ~{BLE} (in), 40 ~{BHE} (in), 41 ~{OE} (in), 42 A7 (in), 43 A6 (in), 44 A5 (in)

## CY7C1061AV33-xxZ
designator IC?
16-Mbit (1M x 16) Static RAM
pins: 1 IO12 (io), 2 VCC (power), 3 IO13 (io), 4 IO14 (io), 5 VSS (power), 6 IO15 (io), 7 A4 (in), 8 A3 (in), 9 A2 (in), 10 A1 (in), 11 A0 (in), 12 ~{BHE} (in), 13 ~{CE1} (in), 14 VCC (power), 15 ~{WE} (in), 16 CE2 (in), 17 A19 (in), 18 A18 (in), 19 A17 (in), 20 A16 (in), 21 A15 (in), 22 IO0 (io), 23 VCC (power), 24 IO1 (io), 25 IO2 (io), 26 VSS (power), 27 IO3 (io), 28 IO4 (io), 29 VCC (power), 30 IO5 (io), 31 IO6 (io), 32 VSS (power), 33 IO7 (io), 34 A14 (in), 35 A13 (in), 36 A12 (in), 37 A11 (in), 38 A10 (in), 39 ~{BLE} (in), 40 DNU (in), 41 VSS (power), 42 ~{OE} (in), 43 NC, 44 A9 (in), 45 A8 (in), 46 A7 (in), 47 A6 (in), 48 A5 (in), 49 IO8 (io), 50 VCC (power), 51 IO9 (io), 52 IO10 (io), 53 VSS (power), 54 IO11 (io)

## CY7C1061DV18-15ZSXI
designator IC?
16-Mbit (1M x 16) Static RAM
pins: 1 IO12 (io), 2 VCC (power), 3 IO13 (io), 4 IO14 (io), 5 VSS (power), 6 IO15 (io), 7 A4 (in), 8 A3 (in), 9 A2 (in), 10 A1 (in), 11 A0 (in), 12 ~{BHE} (in), 13 ~{CE1} (in), 14 VCC (power), 15 ~{WE} (in), 16 CE2 (in), 17 A19 (in), 18 A18 (in), 19 A17 (in), 20 A16 (in), 21 A15 (in), 22 IO0 (io), 23 VCC (power), 24 IO1 (io), 25 IO2 (io), 26 VSS (power), 27 IO3 (io), 28 IO4 (io), 29 VCC (power), 30 IO5 (io), 31 IO6 (io), 32 VSS (power), 33 IO7 (io), 34 A14 (in), 35 A13 (in), 36 A12 (in), 37 A11 (in), 38 A10 (in), 39 ~{BLE} (in), 40 NC (in), 41 VSS (power), 42 ~{OE} (in), 43 NC, 44 A9 (in), 45 A8 (in), 46 A7 (in), 47 A6 (in), 48 A5 (in), 49 IO8 (io), 50 VCC (power), 51 IO9 (io), 52 IO10 (io), 53 VSS (power), 54 IO11 (io)

## CY7C1314KV18-250BZXC
designator IC?
1.8V, 250MHz, 18-Mbit (512k X 36) QDR®II SRAM 2-Word Burst Architecture
part A pins: A1 ~{CQ} (out), A4 ~{WPS} (in), A5 ~{BWS}2 (in), A6 ~{K} (in), A7 ~{BWS}1 (in), A8 ~{RPS} (in), A11 CQ (out), B1 Q27 (out), B2 Q18 (out), B3 D18 (in), B4 A (in), B5 ~{BWS}3 (in), B6 K (in), B7 ~{BWS}0 (in), B8 A (in), B9 D17 (in), B10 Q17 (out), B11 Q8 (out), C1 D27 (in), C2 Q28 (out), C3 D19 (in), C5 A (in), C6 A (in), C7 A (in), C9 D16 (in), C10 Q7 (out), C11 D8 (in), D1 D28 (in), D2 D20 (in), D3 Q19 (out), D9 Q16 (out), D10 D15 (in), D11 D7 (in), E1 Q29 (out), E2 D29 (in), E3 Q20 (out), E9 Q15 (out), E10 D6 (in), E11 Q6 (out), F1 Q30 (out), F2 Q21 (out), F3 D21 (in), F9 D14 (in), F10 Q14 (out), F11 Q5 (out), G1 D30 (in), G2 D22 (in), G3 Q22 (out), G9 Q13 (out), G10 D13 (in), G11 D5 (in), H1 ~{DOF}F (in), H11 ZQ (in), J1 D31 (in), J2 Q31 (out), J3 D23 (in), J9 D12 (in), J10 Q4 (out), J11 D4 (in), K1 Q32 (out), K2 D32 (in), K3 Q23 (out), K9 Q12 (out), K10 D3 (in), K11 Q3 (out), L1 Q33 (out), L2 Q24 (out), L3 D24 (in), L9 D11 (in), L10 Q11 (out), L11 Q2 (out), M1 D33 (in), M2 Q34 (out), M3 D25 (in), M9 D10 (in), M10 Q1 (out), M11 D2 (in), N1 D34 (in), N2 D26 (in), N3 Q25 (out), N5 A (in), N6 A (in), N7 A (in), N9 Q10 (out), N10 D9 (in), N11 D1 (in), P1 Q35 (out), P2 D35 (in), P3 Q26 (out), P4 A (in), P5 A (in), P6 C (in), P7 A (in), P8 A (in), P9 Q9 (out), P10 D0 (in), P11 Q0 (out), R1 TDO (out), R2 TCK (in), R3 A (in), R4 A (in), R5 A (in), R6 ~{C} (in), R7 A (in), R8 A (in), R9 A (in), R10 TMS (in), R11 TDI (in)
part B pins: A2 NC/288M, A3 NC/72M, A9 NC/36M, A10 NC144M, C4 VSS (power), C8 VSS (power), D4 VSS (power), D5 VSS (power), D6 VSS (power), D7 VSS (power), D8 VSS (power), E4 VDDQ (power), E5 VSS (power), E6 VSS (power), E7 VSS (power), E8 VDDQ (power), F4 VDDQ (power), F5 VDD (power), F6 VSS (power), F7 VDD (power), F8 VDDQ (power), G4 VDDQ (power), G5 VDD (power), G6 VSS (power), G7 VDD (power), G8 VDDQ (power), H2 VREF (in), H3 VDDQ (power), H4 VDDQ (power), H5 VDD (power), H6 VSS (power), H7 VDD (power), H8 VDDQ (power), H9 VDDQ (power), H10 VREF (in), J4 VDDQ (power), J5 VDD (power), J6 VSS (power), J7 VDD (power), J8 VDDQ (power), K4 VDDQ (power), K5 VDD (power), K6 VSS (power), K7 VDD (power), K8 VDDQ (power), L4 VDDQ (power), L5 VSS (power), L6 VSS (power), L7 VSS (power), L8 VDDQ (power), M4 VSS (power), M5 VSS (power), M6 VSS (power), M7 VSS (power), M8 VSS (power), N4 VSS (power), N8 VSS (power)
